# Altium footprint library 3.22-杂项.PcbLib: 199 footprints (part 4 of 15)
Each footprint in its own frame and in the unit in brackets; x right, y up, seen from the top. Pads: shape width x height; smd on the part's side, far side on the other; paste and mask are expansions set on the pad; w line width, h text height; cw(c..) or ccw(c..) is an arc to the next point about the centre after c.
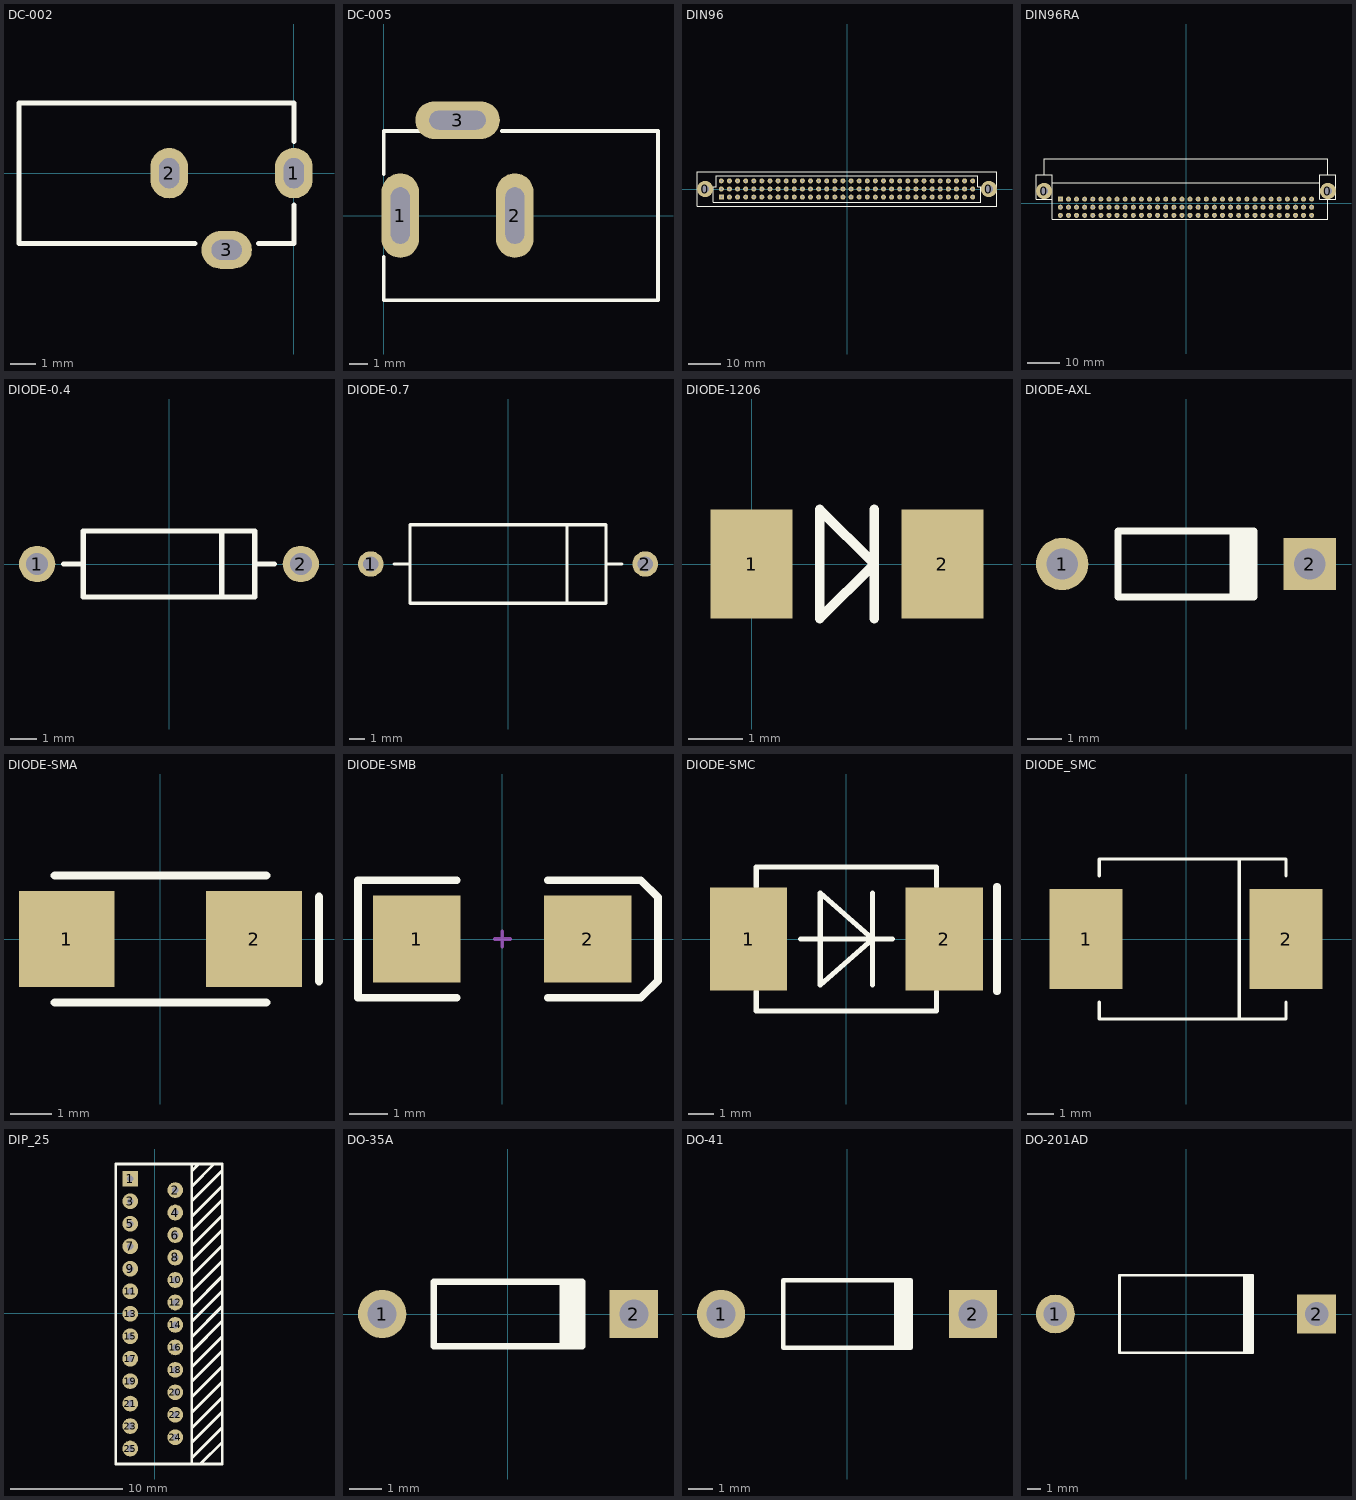
[diagram p3: the footprints below, top view; thin cyan lines are the x and y axes]

## DC-002 [mm] "DC母座3.5mm"
height 7.2
pads (3):
  oval 1.5x2 hole 0.8 slot 1.2 at 90 deg: 1(0,0) 2(-4.953,0)
  oval 2x1.5 hole 0.8 slot 1.2 at 0 deg: 3(-2.667,-3.048)
Top Overlay:
  lines w0.2: -3.937,-2.794 -10.922,-2.794 -10.922,2.794 0,2.794 0,1.27 ; -1.397,-2.794 0,-2.794 0,-1.27
3D body: height 7.2, standoff 0, extent -10.922,-2.794 0,2.794

## DC-005 [mm] "DC母座5.5mm"
height 12.75
pads (3):
  oval 2x4.5 hole 1 slot 3 at 90 deg: 1(0.889,0) 2(6.985,0)
  oval 4.5x2 hole 1 slot 3 at 0 deg: 3(3.937,5.08)
Top Overlay:
  lines w0.2: 0.005,-2.2 0.005,-4.5 14.605,-4.5 14.605,4.5 6.305,4.5 ; 0.005,2.2 0.005,4.5 1.905,4.5
3D body: height 11, standoff 0, extent 0,-4.445 14.605,4.445

## DIN96 [mil]
pads (98):
  round 200 hole 100: 0(-1750,0) 0(1750,0)
  rect 62x62 hole 25: 1A(-1550,-100)
  round 62 hole 25: 1B(-1550,0) 1C(-1550,100) 2A(-1450,-100) 2B(-1450,0) 2C(-1450,100) 3A(-1350,-100) 3B(-1350,0) 3C(-1350,100) 4A(-1250,-100) 4B(-1250,0) 4C(-1250,100) 5A(-1150,-100) 5B(-1150,0) 5C(-1150,100) 6A(-1050,-100) 6B(-1050,0) 6C(-1050,100) 7A(-950,-100) 7B(-950,0) 7C(-950,100) 8A(-850,-100) 8B(-850,0) 8C(-850,100) 9A(-750,-100) 9B(-750,0) 9C(-750,100) 10A(-650,-100) 10B(-650,0) 10C(-650,100) 11A(-550,-100) 11B(-550,0) 11C(-550,100) 12A(-450,-100) 12B(-450,0) 12C(-450,100) 13A(-350,-100) 13B(-350,0) 13C(-350,100) 14A(-250,-100) 14B(-250,0) 14C(-250,100) 15A(-150,-100) 15B(-150,0) 15C(-150,100) 16A(-50,-100) 16B(-50,0) 16C(-50,100) 17A(50,-100) 17B(50,0) 17C(50,100) 18A(150,-100) 18B(150,0) 18C(150,100) 19A(250,-100) 19B(250,0) 19C(250,100) 20A(350,-100) 20B(350,0) 20C(350,100) 21A(450,-100) 21B(450,0) 21C(450,100) 22A(550,-100) 22B(550,0) 22C(550,100) 23A(650,-100) 23B(650,0) 23C(650,100) 24A(750,-100) 24B(750,0) 24C(750,100) 25A(850,-100) 25B(850,0) 25C(850,100) 26A(950,-100) 26B(950,0) 26C(950,100) 27A(1050,-100) 27B(1050,0) 27C(1050,100) 28A(1150,-100) 28B(1150,0) 28C(1150,100) 29A(1250,-100) 29B(1250,0) 29C(1250,100) 30A(1350,-100) 30B(1350,0) 30C(1350,100) 31A(1450,-100) 31B(1450,0) 31C(1450,100) 32A(1550,-100) 32B(1550,0) 32C(1550,100)
Top Overlay:
  lines w10: -1850,-210 -1850,210 1850,210 1850,-210 -1850,-210 ; -1650,-165 -1650,30 -1615,30 -1615,165 1615,165 1615,30 1650,30 1650,-165 -1650,-165

## DIN96RA [mil]
pads (98):
  round 200 hole 100: 0(-1750,150) 0(1750,150)
  rect 62x62 hole 25: 1A(-1550,50)
  round 62 hole 25: 1B(-1550,-50) 1C(-1550,-150) 2A(-1450,50) 2B(-1450,-50) 2C(-1450,-150) 3A(-1350,50) 3B(-1350,-50) 3C(-1350,-150) 4A(-1250,50) 4B(-1250,-50) 4C(-1250,-150) 5A(-1150,50) 5B(-1150,-50) 5C(-1150,-150) 6A(-1050,50) 6B(-1050,-50) 6C(-1050,-150) 7A(-950,50) 7B(-950,-50) 7C(-950,-150) 8A(-850,50) 8B(-850,-50) 8C(-850,-150) 9A(-750,50) 9B(-750,-50) 9C(-750,-150) 10A(-650,50) 10B(-650,-50) 10C(-650,-150) 11A(-550,50) 11B(-550,-50) 11C(-550,-150) 12A(-450,50) 12B(-450,-50) 12C(-450,-150) 13A(-350,50) 13B(-350,-50) 13C(-350,-150) 14A(-250,50) 14B(-250,-50) 14C(-250,-150) 15A(-150,50) 15B(-150,-50) 15C(-150,-150) 16A(-50,50) 16B(-50,-50) 16C(-50,-150) 17A(50,50) 17B(50,-50) 17C(50,-150) 18A(150,50) 18B(150,-50) 18C(150,-150) 19A(250,50) 19B(250,-50) 19C(250,-150) 20A(350,50) 20B(350,-50) 20C(350,-150) 21A(450,50) 21B(450,-50) 21C(450,-150) 22A(550,50) 22B(550,-50) 22C(550,-150) 23A(650,50) 23B(650,-50) 23C(650,-150) 24A(750,50) 24B(750,-50) 24C(750,-150) 25A(850,50) 25B(850,-50) 25C(850,-150) 26A(950,50) 26B(950,-50) 26C(950,-150) 27A(1050,50) 27B(1050,-50) 27C(1050,-150) 28A(1150,50) 28B(1150,-50) 28C(1150,-150) 29A(1250,50) 29B(1250,-50) 29C(1250,-150) 30A(1350,50) 30B(1350,-50) 30C(1350,-150) 31A(1450,50) 31B(1450,-50) 31C(1450,-150) 32A(1550,50) 32B(1550,-50) 32C(1550,-150)
Top Overlay:
  lines w10: -1650,250 1650,250 ; 1750,50 1750,-200 -1650,-200 -1650,50 ; -1750,350 -1750,550 1750,550 1750,350 ; -1750,350 -1850,350 -1850,50 -1650,50 ; -1750,350 -1650,350 -1650,50 ; 1750,350 1650,350 1650,50 1850,50 1850,350 1750,350

## DIODE-0.4 [mm] "1  2"
height 2.54
pads (2):
  round 1.4 hole 0.85: 1(-5.08,0) 2(5.08,0)
Top Overlay:
  lines w0.2: -4.064,0 -3.302,0 ; 2.032,-1.27 2.032,1.27 ; 3.302,0 4.064,0 ; -3.302,-1.27 3.302,-1.27 3.302,1.27 -3.302,1.27 -3.302,-1.27

## DIODE-0.7 [mm] "Zener Diode; 2 Leads"
height 5.08
pads (2):
  round 1.65 hole 1: 1(-8.89,0) 2(8.89,0)
Top Overlay:
  lines w0.2: -7.366,0 -6.35,0 ; 3.81,-2.54 3.81,2.54 ; 6.35,0 7.366,0 ; -6.35,-2.54 6.35,-2.54 6.35,2.54 -6.35,2.54 -6.35,-2.54

## DIODE-1206 [mm] "玻璃封装二极管"
height 3
pads (2):
  rect 1.5x2 smd: 1(0,0) 2(3.5,0)
Top Overlay:
  lines w0.178: 2.25,-1 2.25,1 ; 1.25,-1 1.25,1 2.25,0 1.25,-1

## DIODE-AXL [mm] "直插二极管"
height 1.9
pads (2):
  round 1.5 hole 0.9: 1(-3.55,0)
  rect 1.5x1.5 hole 0.9: 2(3.55,0)
Top Overlay:
  rectangle: 1.25,-0.95 2.05,0.95
  lines w0.2: 1.95,-0.95 -1.95,-0.95 -1.95,0.95 1.95,0.95

## DIODE-SMA [mm] "贴片二极管"
height 2.54
pads (2):
  rect 2.3x2.3 smd: 1(-2.25,0) 2(2.25,0)
Top Overlay:
  lines w0.2: -2.54,-1.524 2.54,-1.524 ; -2.54,1.524 2.54,1.524 ; 3.81,-1.016 3.81,1.016
3D body: height 3, standoff 0, extent -2.921,-1.397 2.921,1.397

## DIODE-SMB [mm] "DO-214-AA/SMB; 2 C-Bend Leads; Body 5.3 x 3.6 mm, inc. leads (LxW)"
height 2.54
pads (2):
  rect 2.3x2.3 smd: 1(-2.25,0) 2(2.25,0)
Top Overlay:
  lines w0.2: -1.2,-1.55 -3.8,-1.55 -3.8,1.55 -1.2,1.55 ; 1.2,-1.55 3.65,-1.55 4.1,-1.1 4.1,1.1 3.65,1.55 1.2,1.55
Mechanical 1:
  lines w0.1: -0.2,0 0.2,0 ; 0,-0.2 0,0.2

## DIODE-SMC [mm] "贴片二极管"
height 1.5
pads (2):
  rect 3x4 smd: 1(-3.8,0) 2(3.8,0)
Top Overlay:
  lines w0.2: -3.5,-2.032 -3.5,-2.794 3.5,-2.794 3.5,-2.032 ; -3.5,2.032 -3.5,2.794 3.5,2.794 3.5,2.032 ; -1.778,0 1.778,0 ; 1.016,-1.778 1.016,1.778 ; -1.016,-1.778 -1.016,1.778 1.016,0 -1.016,-1.778
  lines w0.3: 5.842,-2.032 5.842,2.032
3D body: height 0.8, standoff 0, extent -3.81,-1.905 -3.429,1.905
3D body: height 0.8, standoff 0, extent 3.556,-1.905 3.937,1.905
3D body: height 1, standoff 0, extent -3.429,-2.794 3.556,2.794
3D body: height 1.05, standoff 1, extent 2.921,-2.794 3.429,2.794

## DIODE_SMC [mil] "Magnetic-Core Inductor with Winding Polarity Marking; 2 Leads"
pads (2):
  rect 110x150 smd: 1(-150,0) 2(150,0)
Top Overlay:
  lines w5: -130,-95 -130,-120 150,-120 150,-95 ; -130,95 -130,120 150,120 150,95 ; 80,-120 80,120
Mechanical 1:
  lines w1: -130,-120 150,-120 ; -130,120 150,120

## DIP_25 [mm]
height 22
pads (25):
  rect 1.4x1.4 hole 0.6: 1(-2.184,11.963)
  round 1.4 hole 0.6: 2(1.816,10.963) 3(-2.184,9.963) 4(1.816,8.963) 5(-2.184,7.963) 6(1.816,6.963) 7(-2.184,5.963) 8(1.816,4.963) 9(-2.184,3.963) 10(1.816,2.963) 11(-2.184,1.963) 12(1.816,0.963) 13(-2.184,-0.037) 14(1.816,-1.037) 15(-2.184,-2.037) 16(1.816,-3.037) 17(-2.184,-4.037) 18(1.816,-5.037) 19(-2.184,-6.037) 20(1.816,-7.037) 21(-2.184,-8.037) 22(1.816,-9.037) 23(-2.184,-10.037) 24(1.816,-11.037) 25(-2.184,-12.037)
Top Overlay:
  lines w0.254: 3.283,-13.324 3.283,13.194 ; 3.283,-12.968 3.283,-12.867 6.001,-10.149 ; 3.283,-11.495 6.001,-8.777 ; 3.283,-10.2 6.001,-7.482 ; 3.283,-8.828 6.001,-6.11 ; 3.283,-7.558 3.283,-7.456 6.001,-4.739 ; 3.283,-6.085 6.001,-3.367 ; 3.283,-4.789 6.001,-2.072 ; 3.283,-3.418 6.001,-0.7 ; 3.283,-2.199 3.283,-2.097 6.001,0.621 ; 3.283,-0.725 6.001,1.992 ; 3.283,0.57 6.001,3.288 ; 3.283,1.942 6.001,4.659 ; 3.283,3.212 3.283,3.313 6.001,6.031 ; 3.283,4.685 6.001,7.403 ; 3.283,5.98 6.001,8.698 ; 3.283,7.352 6.001,10.07 ; 3.283,8.52 3.283,8.622 6.001,11.34 ; 3.283,9.993 6.001,12.711 ; 3.283,11.289 5.277,13.283 ; 3.283,12.66 3.906,13.283 ; 4.096,-13.375 5.976,-11.495 ; 6,13.27 6,-13.411 -3.473,-13.411 -3.473,13.27 6.001,13.27

## DO-35A [mm] "Diode, Axial; Body 4.6 x 1.9 mm (LxDia. max), Lead Dia. 0.53 mm (max)"
height 2
pads (2):
  round 1.5 hole 0.9: 1(-3.9,0)
  rect 1.5x1.5 hole 0.9: 2(3.9,0)
Top Overlay:
  rectangle: 1.6,-1 2.4,1
  lines w0.2: 2.3,-1 -2.3,-1 -2.3,1 2.3,1

## DO-41 [mm] "Diode, Axial; Body 5.2 x 2.7 mm (LxDia. max), Lead Dia. 0.86 mm (max)"
height 2.8
pads (2):
  round 2 hole 1.2: 1(-5.23,0)
  rect 2x2 hole 1.2: 2(5.23,0)
Top Overlay:
  rectangle: 1.95,-1.4 2.75,1.4
  lines w0.2: 2.65,-1.4 -2.65,-1.4 -2.65,1.4 2.65,1.4

## DO-201AD [mm] "Diode, Axial; Body 9.5 x 5.6 mm (LxDia. max), Lead Dia. 1.32 mm (max)"
height 5.6
pads (2):
  round 2.8 hole 1.7: 1(-9.42,0)
  rect 2.8x2.8 hole 1.7: 2(9.42,0)
Top Overlay:
  rectangle: 4.1,-2.8 4.9,2.8
  lines w0.2: 4.8,-2.8 -4.8,-2.8 -4.8,2.8 4.8,2.8